# Altium footprint library Miscellaneous Devices LC.PcbLib: 733 footprints (part 45 of 46)
Each footprint in its own frame and in the unit in brackets; x right, y up, seen from the top. Pads: shape width x height; smd on the part's side, far side on the other; paste and mask are expansions set on the pad; w line width, h text height; cw(c..) or ccw(c..) is an arc to the next point about the centre after c.
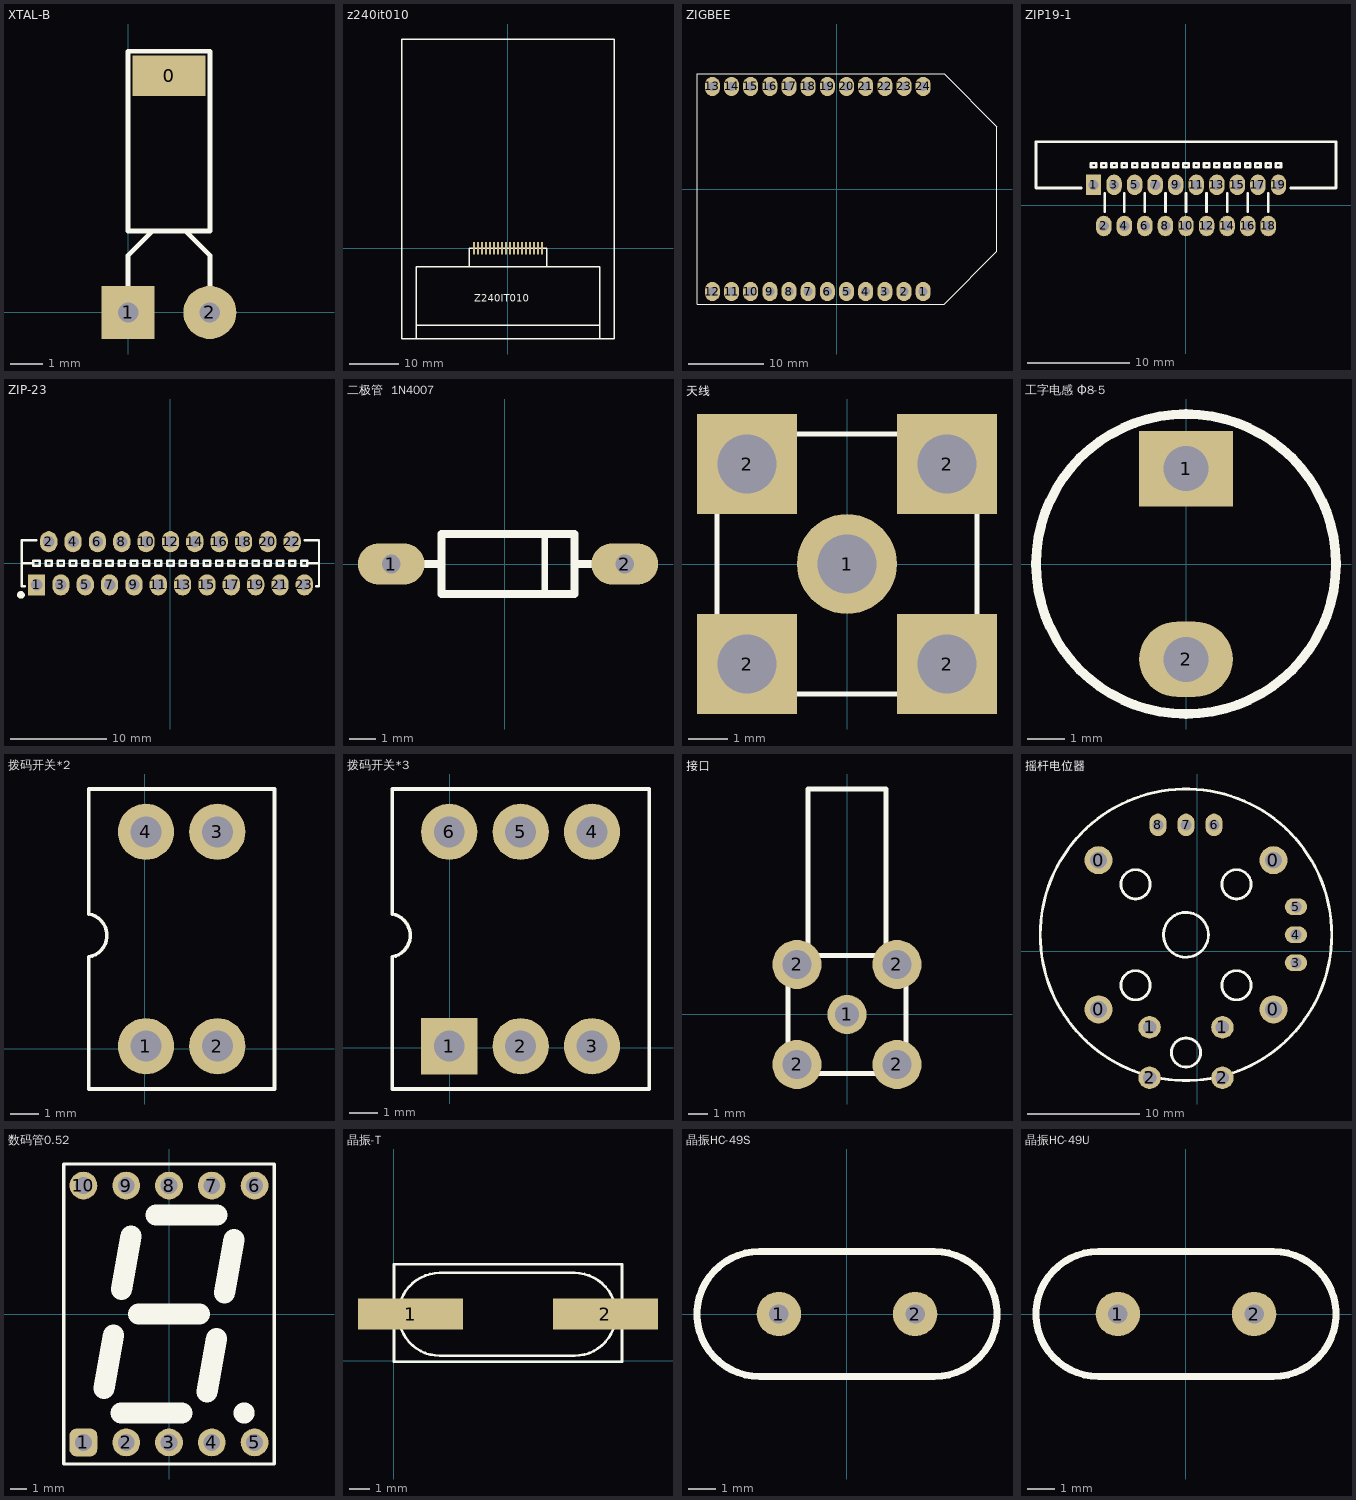
[diagram p44: the footprints below, top view; thin cyan lines are the x and y axes]

## XTAL-B [mm]
pads (3):
  rect 2.286x1.27 smd: 0(1.27,7.366)
  rect 1.65x1.65 hole 0.635: 1(0,0)
  round 1.65 hole 0.635: 2(2.54,0)
Top Overlay:
  lines w0.152: 0,0.762 0,1.778 0.762,2.54 ; 1.524,2.54 1.778,2.54 2.54,1.778 2.54,0.762 ; 0,2.54 2.54,2.54 2.54,8.128 0,8.128 0,2.54

## z240it010 [mm]
pads (18):
  rect 0.4x2.5 smd: 1(-6.8,0) 2(-6,0) 3(-5.2,0) 4(-4.4,0) 5(-3.6,0) 6(-2.8,0) 7(-2,0) 8(-1.2,0) 9(-0.4,0) 10(0.4,0) 11(1.2,0) 12(2,0) 13(2.8,0) 14(3.6,0) 15(4.4,0) 16(5.2,0) 17(6,0) 18(6.8,0)
Top Overlay:
  lines w0.254: -18.4,-18.2 -18.4,-3.7 18.4,-3.7 18.4,-18.2 ; -18.4,-15.4 0,-15.4 18.4,-15.4 ; -7.8,-3.7 -7.8,0 0,0 7.8,0 7.8,-3.7 ; 18.4,-17.2 18.4,-15.4 ; 18.4,-13.6 18.4,-15.4 ; -21.36,-18.2 0,-18.2 21.4,-18.2 21.4,42.04 -21.36,42.04 -21.36,-18.2
  text "Z240IT010" at -6.8,-10.7 h1.5

## ZIGBEE [mm]
pads (24):
  oval 2x2.54 hole 1.2: 1(11.43,-13.589) 2(8.89,-13.589) 3(6.35,-13.589) 4(3.81,-13.589) 5(1.27,-13.589) 6(-1.27,-13.589) 7(-3.81,-13.589) 8(-6.35,-13.589) 9(-8.89,-13.589) 10(-11.43,-13.589) 11(-13.97,-13.589) 12(-16.51,-13.589) 13(-16.51,13.589) 14(-13.97,13.589) 15(-11.43,13.589) 16(-8.89,13.589) 17(-6.35,13.589) 18(-3.81,13.589) 19(-1.27,13.589) 20(1.27,13.589) 21(3.81,13.589) 22(6.35,13.589) 23(8.89,13.589) 24(11.43,13.589)
Top Overlay:
  lines w0.127: -18.542,-15.24 14.224,-15.24 21.209,-8.255 21.209,8.255 14.224,15.24 -18.542,15.24 -18.542,-15.24

## ZIP19-1 [mm]
pads (19):
  rect 1.5x2 hole 1: 1(-9,2)
  oval 1.5x2 hole 1: 2(-8,-2) 3(-7,2) 4(-6,-2) 5(-5,2) 6(-4,-2) 7(-3,2) 8(-2,-2) 9(-1,2) 10(0,-2) 11(1,2) 12(2,-2) 13(3,2) 14(4,-2) 15(5,2) 16(6,-2) 17(7,2) 18(8,-2) 19(9,2)
Top Overlay:
  lines w0.254: -10.2,1.7 -14.6,1.7 -14.6,6.2 14.6,6.2 14.6,1.7 10.2,1.7 ; -7.9,-0.6 -7.9,1.2 ; -6,-0.6 -6,1.2 ; -4,-0.6 -4,1.2 ; -2,-0.6 -2,1.2 ; 0,-0.6 0,1.2 ; 2,-0.6 2,1.2 ; 4,-0.6 4,1.2 ; 6,-0.6 6,1.2 ; 8,-0.6 8,1.2 ; -9.25,3.7 -8.75,3.7 -8.75,4.1 -9.25,4.1 -9.25,3.7 ; -8.25,3.7 -8.25,4.1 -7.75,4.1 -7.75,3.7 -8.25,3.7 ; -7.25,3.7 -6.75,3.7 -6.75,4.1 -7.25,4.1 -7.25,3.7 ; -6.25,3.7 -6.25,4.1 -5.75,4.1 -5.75,3.7 -6.25,3.7 ; -5.25,3.7 -4.75,3.7 -4.75,4.1 -5.25,4.1 -5.25,3.7 ; -4.25,3.7 -4.25,4.1 -3.75,4.1 -3.75,3.7 -4.25,3.7 ; -3.25,3.7 -2.75,3.7 -2.75,4.1 -3.25,4.1 -3.25,3.7 ; -2.25,3.7 -2.25,4.1 -1.75,4.1 -1.75,3.7 -2.25,3.7 ; -1.25,3.7 -1.25,4.1 -0.75,4.1 -0.75,3.7 -1.25,3.7 ; -0.25,3.7 0.25,3.7 0.25,4.1 -0.25,4.1 -0.25,3.7 ; 0.75,3.7 1.25,3.7 1.25,4.1 0.75,4.1 0.75,3.7 ; 1.75,3.7 1.75,4.1 2.25,4.1 2.25,3.7 1.75,3.7 ; 2.75,3.7 3.25,3.7 3.25,4.1 2.75,4.1 2.75,3.7 ; 3.75,3.7 3.75,4.1 4.25,4.1 4.25,3.7 3.75,3.7 ; 4.75,3.7 5.25,3.7 5.25,4.1 4.75,4.1 4.75,3.7 ; 5.75,3.7 5.75,4.1 6.25,4.1 6.25,3.7 5.75,3.7 ; 6.75,3.7 7.25,3.7 7.25,4.1 6.75,4.1 6.75,3.7 ; 7.75,3.7 7.75,4.1 8.25,4.1 8.25,3.7 7.75,3.7 ; 8.75,3.7 9.25,3.7 9.25,4.1 8.75,4.1 8.75,3.7

## ZIP-23 [mm]
pads (23):
  rect 1.8x2.2 hole 1.2: 1(-13.97,-2.25)
  oval 1.8x2.2 hole 1.2: 2(-12.7,2.25) 3(-11.43,-2.25) 4(-10.16,2.25) 5(-8.89,-2.25) 6(-7.62,2.25) 7(-6.35,-2.25) 8(-5.08,2.25) 9(-3.81,-2.25) 10(-2.54,2.25) 11(-1.27,-2.25) 12(0,2.25) 13(1.27,-2.25) 14(2.54,2.25) 15(3.81,-2.25) 16(5.08,2.25) 17(6.35,-2.25) 18(7.62,2.25) 19(8.89,-2.25) 20(10.16,2.25) 21(11.43,-2.25) 22(12.7,2.25) 23(13.97,-2.25)
Top Overlay:
  circle w0.4: c-15.6,-3.3 r0.2
  lines w0.254: -15.5,0 -14.5,0 ; -15.2,-2.4 -15.5,-2.4 -15.5,2.4 -14,2.4 ; 14,2.4 15.5,2.4 15.5,-2.4 15.2,-2.4 ; 14.5,0 15.5,0 ; -14.295,-0.275 -14.295,0.275 -13.645,0.275 -13.645,-0.275 -14.295,-0.275 ; -13.025,-0.275 -12.375,-0.275 -12.375,0.275 -13.025,0.275 -13.025,-0.275 ; -11.755,-0.275 -11.755,0.275 -11.105,0.275 -11.105,-0.275 -11.755,-0.275 ; -10.485,-0.275 -9.835,-0.275 -9.835,0.275 -10.485,0.275 -10.485,-0.275 ; -9.215,-0.275 -9.215,0.275 -8.565,0.275 -8.565,-0.275 -9.215,-0.275 ; -7.945,-0.275 -7.295,-0.275 -7.295,0.275 -7.945,0.275 -7.945,-0.275 ; -6.675,-0.275 -6.675,0.275 -6.025,0.275 -6.025,-0.275 -6.675,-0.275 ; -5.405,-0.275 -4.755,-0.275 -4.755,0.275 -5.405,0.275 -5.405,-0.275 ; -4.135,-0.275 -4.135,0.275 -3.485,0.275 -3.485,-0.275 -4.135,-0.275 ; -2.865,-0.275 -2.215,-0.275 -2.215,0.275 -2.865,0.275 -2.865,-0.275 ; -1.595,-0.275 -0.945,-0.275 -0.945,0.275 -1.595,0.275 -1.595,-0.275 ; -0.325,-0.275 -0.325,0.275 0.325,0.275 0.325,-0.275 -0.325,-0.275 ; 0.945,-0.275 0.945,0.275 1.595,0.275 1.595,-0.275 0.945,-0.275 ; 2.215,-0.275 2.215,0.275 2.865,0.275 2.865,-0.275 2.215,-0.275 ; 3.485,-0.275 4.135,-0.275 4.135,0.275 3.485,0.275 3.485,-0.275 ; 4.755,-0.275 4.755,0.275 5.405,0.275 5.405,-0.275 4.755,-0.275 ; 6.025,-0.275 6.675,-0.275 6.675,0.275 6.025,0.275 6.025,-0.275 ; 7.295,-0.275 7.295,0.275 7.945,0.275 7.945,-0.275 7.295,-0.275 ; 8.565,-0.275 9.215,-0.275 9.215,0.275 8.565,0.275 8.565,-0.275 ; 9.835,-0.275 9.835,0.275 10.485,0.275 10.485,-0.275 9.835,-0.275 ; 11.105,-0.275 11.755,-0.275 11.755,0.275 11.105,0.275 11.105,-0.275 ; 12.375,-0.275 12.375,0.275 13.025,0.275 13.025,-0.275 12.375,-0.275 ; 13.645,-0.275 13.645,0.275 14.295,0.275 14.295,-0.275 13.645,-0.275

## 二极管  1N4007 [mil]
pads (2):
  oval 100x62 hole 28: 1(-170,0) 2(180,0)
Top Overlay:
  lines w10: 60,-45 60,45
  lines w12: -170,0 -95,0 ; 105,0 180,0 ; -95,-45 -95,45 105,45 105,-45 -95,-45

## 天线 [mm]
height 10
pads (5):
  round 2.54 hole 1.5: 1(0,0)
  rect 2.54x2.54 hole 1.5: 2(-2.54,-2.54) 2(-2.54,2.54) 2(2.54,-2.54) 2(2.54,2.54)
Top Overlay:
  lines w0.127: -3.302,-3.302 -3.302,3.302 3.302,3.302 3.302,-3.302 -3.302,-3.302

## 工字电感 Φ8-5 [mm]
pads (2):
  rect 2.5x2 hole 1.2: 1(0,2.54)
  oval 2.5x2 hole 1.2: 2(0,-2.54)
Top Overlay:
  circle w0.254: c0,0 r4

## 拨码开关*2 [mm]
pads (4):
  round 2 hole 1.1: 1(0.05,0.09) 2(2.59,0.09) 3(2.59,7.71) 4(0.05,7.71)
Top Overlay:
  lines w0.127: -1.982,-1.434 -1.982,2.122 -1.982,3.265 ccw(c-2.109,4.027) -1.982,4.789 -1.982,5.678 -1.982,9.234 4.622,9.234 4.622,-1.434 -1.982,-1.434

## 拨码开关*3 [mm]
pads (6):
  rect 2x2 hole 1.1: 1(-0.02,0.058)
  round 2 hole 1.1: 2(2.52,0.058) 3(5.06,0.058) 4(5.06,7.678) 5(2.52,7.678) 6(-0.02,7.678)
Top Overlay:
  lines w0.127: -2.052,-1.466 -2.052,2.09 -2.052,3.233 ccw(c-2.179,3.995) -2.052,4.757 -2.052,5.646 -2.052,9.202 7.092,9.202 7.092,-1.466 -2.052,-1.466

## 接口 [mm]
pads (5):
  round 2 hole 1.2: 1(0,0)
  round 2.5 hole 1.5: 2(-2.55,-2.55) 2(-2.55,2.55) 2(2.55,-2.55) 2(2.55,2.55)
Top Overlay:
  lines w0.254: -2,3 -2,11.5 2,11.5 2,3 ; -3,-3 -3,3 3,3 3,-3 -3,-3

## 摇杆电位器 [mm]
pads (14):
  round 2.5 hole 1.5: 0(-8.8,-5.175) 0(-8.8,8.125) 0(6.8,-5.175) 0(6.8,8.125)
  round 2 hole 1.2: 1(-4.25,-6.775) 1(2.25,-6.775) 2(-4.25,-11.275) 2(2.25,-11.275)
  oval 2x1.5 hole 1: 3(8.8,-1.025) 4(8.8,1.475) 5(8.8,3.975)
  oval 1.5x2 hole 1: 6(1.5,11.275) 7(-1,11.275) 8(-3.5,11.275)
Top Overlay:
  circle w0.254: c-1,1.475 r13
  circle w0.254: c-1,1.475 r2
  circle w0.254: c3.5,5.975 r1.3
  circle w0.254: c-5.5,5.975 r1.3
  circle w0.254: c-5.5,-3.025 r1.3
  circle w0.254: c3.5,-3.025 r1.3
  circle w0.254: c-1,-9.025 r1.3

## 数码管0.52 [mm]
pads (10):
  rrect50% 1.65x1.65 hole 1: 1(-5.08,-7.62)
  round 1.65 hole 1: 2(-2.54,-7.62) 3(0,-7.62) 4(2.54,-7.62) 5(5.08,-7.62) 6(5.08,7.62) 7(2.54,7.62) 8(0,7.62) 9(-2.54,7.62) 10(-5.08,7.62)
Top Overlay:
  circle w0.85: c4.455,-5.872 r0.2
  lines w0.2: -6.25,-8.9 -6.25,8.9 6.25,8.9 6.25,-8.9 -6.25,-8.9
  lines w1.25: -3.857,-4.427 -3.295,-1.251 ; -2.84,-5.875 0.756,-5.875 ; -2.818,1.449 -2.257,4.627 ; -1.802,0 1.802,0 ; -0.767,5.875 2.837,5.875 ; 2.26,-4.624 2.818,-1.45 ; 3.295,1.25 3.854,4.424

## 晶振-T [mm]
pads (2):
  rect 5.08x1.5 smd: 1(0.816,2.262) 2(10.216,2.262)
Top Overlay:
  lines w0.127: 0.016,-0.038 0.016,4.662 11.016,4.662 11.016,-0.038 0.016,-0.038 ; 2.227,0.248 cw(c2.227,2.248) 2.227,4.248 8.727,4.248 cw(c8.727,2.248) 8.727,0.248 2.227,0.248

## 晶振HC-49S [mm]
pads (2):
  round 1.6 hole 0.7: 1(-2.45,0) 2(2.45,0)
Top Overlay:
  lines w0.254: -3.15,-2.248 cw(c-3.15,0) -3.15,2.248 3.15,2.248 cw(c3.15,0) 3.15,-2.248 -3.15,-2.248
3D body "hc-49s_n.stp": height 3.6, standoff -2.9, extent -5.388,-2.27 5.412,2.23

## 晶振HC-49U [mm]
pads (2):
  round 1.6 hole 0.7: 1(-2.45,0) 2(2.45,0)
Top Overlay:
  lines w0.254: -3.15,-2.248 cw(c-3.15,0) -3.15,2.248 3.15,2.248 cw(c3.15,0) 3.15,-2.248 -3.15,-2.248
3D body "hc-49u_n.stp": height 13.1, standoff -2.9, extent -5.398,-2.245 5.402,2.255